# Altium integrated library Cap-Cer-SMD_V2.IntLib: 957 symbols (part 3 of 7)
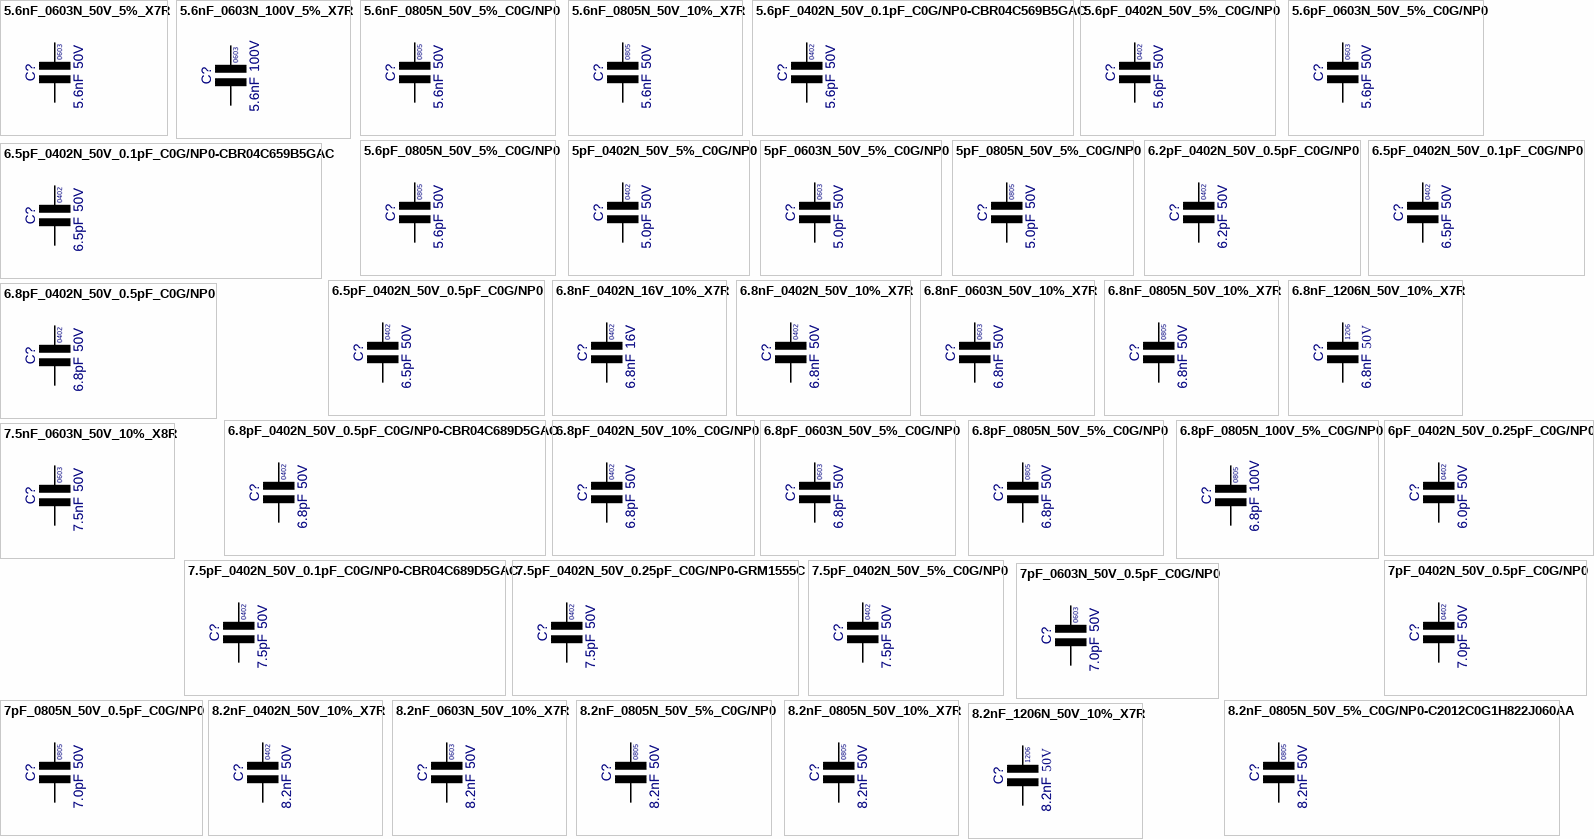
[diagram p25: symbols 5.6nF_0603N_50V_5%_X7R to 8.2nF_1206N_50V_10%_X7R]

## 6.8nF_0402N_16V_10%_X7R
designator C?, comment value 6.8nF  Voltage: 16V  Text1: 0402  (hidden comment: 6.8nF_C0402_16V_10%_X7R)
Cap Ceramic X7R; Manufacturer: Various; Part Number: 6.8nF 0402 16V 10% X7R; Tol: 10%; Package: CAPC0402X60N; EDM-PN: *; Text2: *; SAAB PN: *; DCE Part No: *
footprint CAPC0402X60N (Chip Capacitor, 0402, 2-Leads, Body 1.0x0.5mm, IPC Medium Density)
pins: 1, 2

## 6.8nF_0402N_50V_10%_X7R
designator C?, comment value 6.8nF  Voltage: 50V  Text1: 0402  (hidden comment: 6.8nF_C0402_50V_10%_X7R)
Cap Ceramic X7R; Manufacturer: Various; Part Number: 6.8nF 0402 50V 10% X7R; Tol: 10%; Package: CAPC0402X60N; EDM-PN: *; Text2: *; SAAB PN: *; DCE Part No: *
footprint CAPC0402X60N (Chip Capacitor, 0402, 2-Leads, Body 1.0x0.5mm, IPC Medium Density)
pins: 1, 2

## 6.8nF_0603N_50V_10%_X7R
designator C?, comment value 6.8nF  Voltage: 50V  Text1: 0603  (hidden comment: 6.8nF_C0603_50V_10%_X7R)
Cap Ceramic X7R; Manufacturer: Various; Part Number: 6.8nF 0603 50V 10% X7R; EDM-PN: CAP725; Tol: 10%; Reutech PN: 5910-CA-0568; Package: CAPC0603X85N; Text2: *; SAAB PN: *; DCE Part No: *
footprint CAPC0603X85N (Chip Capacitor, 0603, 2-Leads, Body 1.6x0.8mm, IPC Medium Density)
pins: 1, 2

## 6.8nF_0805N_50V_10%_X7R
designator C?, comment value 6.8nF  Voltage: 50V  Text1: 0805  (hidden comment: 6.8nF_C0805_50V_10%_X7R)
Cap Ceramic X7R; Manufacturer: Various; Part Number: 6.8nF 0805 50V 10% X7R; Tol: 10%; Package: CAPC0805X110N; EDM-PN: *; Text2: *; SAAB PN: *; DCE Part No: *
footprint CAPC0805X110N (Chip Capacitor, 0805, 2-Leads, Body 2.0x1.3mm, IPC Medium Density)
pins: 1, 2

## 6.8nF_1206N_50V_10%_X7R
designator C?, comment value 6.8nF  Voltage: 50V  Text1: 1206  (hidden comment: 6.8nF_C1206_50V_10%_X7R)
Cap Ceramic X7R; Manufacturer: Various; Part Number: 6.8nF 1206 50V 10% X7R; Tol: 10%; Package: CAPC1206X135N; EDM-PN: *; Text2: *; SAAB PN: *; DCE Part No: *
footprint CAPC1206X135N (Chip Capacitor, 1206, 2-Leads, Body 3.2x1.6mm, IPC Medium Density)
pins: 1, 2

## 6.8pF_0402N_50V_0.5pF_C0G/NP0
designator C?, comment value 6.8pF  Voltage: 50V  Text1: 0402  (hidden comment: 6.8pF_C0402_50V_0.5pF_C0G/NP0)
Cap Ceramic C0G/NP0; Manufacturer: Various; Part Number: 6.8pF 0402 50V 0.5pF C0G/NP0; Tol: 0.5pF; Package: CAPC0402X60N; EDM-PN: *; Text2: *; SAAB PN: *; DCE Part No: *
footprint CAPC0402X60N (Chip Capacitor, 0402, 2-Leads, Body 1.0x0.5mm, IPC Medium Density)
pins: 1, 2

## 6.8pF_0402N_50V_0.5pF_C0G/NP0-CBR04C689D5GAC
designator C?, comment value 6.8pF  Voltage: 50V  Text1: 0402  (hidden comment: CBR04C689D5GAC)
Cap Ceramic C0G/NP0 HiQ-CBR Series for RF; Manufacturer: Kemet; EDM-PN: CAP1398; Tol: 0.5pF; Part Number: CBR04C689D5GAC; Package: CAPC0402X60N; Text2: *; SAAB PN: *; DCE Part No: *
footprint CAPC0402X60N (Chip Capacitor, 0402, 2-Leads, Body 1.0x0.5mm, IPC Medium Density)
pins: 1, 2

## 6.8pF_0402N_50V_10%_C0G/NP0
designator C?, comment value 6.8pF  Voltage: 50V  Text1: 0402  (hidden comment: 6.8pF_C0402_50V_10%_C0G/NP0)
Cap Ceramic C0G/NP0; Manufacturer: Various; Part Number: 6.8pF 0402 50V 10% C0G/NP0; Tol: 10%; Package: CAPC0402X60N; EDM-PN: *; Text2: *; SAAB PN: *; DCE Part No: *
footprint CAPC0402X60N (Chip Capacitor, 0402, 2-Leads, Body 1.0x0.5mm, IPC Medium Density)
pins: 1, 2

## 6.8pF_0603N_50V_5%_C0G/NP0
designator C?, comment value 6.8pF  Voltage: 50V  Text1: 0603  (hidden comment: 6.8pF_C0603_50V_5%_C0G/NP0)
Cap Ceramic C0G/NP0; Manufacturer: Various; Part Number: 6.8pF 0603 50V 5% C0G/NP0; EDM-PN: CAP648; Tol: 5%; Package: CAPC0603X85N; Text2: *; SAAB PN: *; DCE Part No: *
footprint CAPC0603X85N (Chip Capacitor, 0603, 2-Leads, Body 1.6x0.8mm, IPC Medium Density)
pins: 1, 2

## 6.8pF_0805N_50V_5%_C0G/NP0
designator C?, comment value 6.8pF  Voltage: 50V  Text1: 0805  (hidden comment: 6.8pF_C0805_50V_5%_C0G/NP0)
Cap Ceramic C0G/NP0; Manufacturer: Various; Part Number: 6.8pF 0805 50V 5% C0G/NP0; EDM-PN: CAP16; Tol: 5%; Package: CAPC0805X110N; Text2: *; SAAB PN: *; DCE Part No: *
footprint CAPC0805X110N (Chip Capacitor, 0805, 2-Leads, Body 2.0x1.3mm, IPC Medium Density)
pins: 1, 2

## 6.8pF_0805N_100V_5%_C0G/NP0
designator C?, comment value 6.8pF  Voltage: 100V  Text1: 0805  (hidden comment: 6.8pF_C0805_100V_5%_C0G/NP0)
Cap Ceramic C0G/NP0; Manufacturer: Various; Part Number: 6.8pF 0805 100V 5% C0G/NP0; Tol: 5%; Package: CAPC0805X110N; Text2: *; SAAB PN: *; DCE Part No: *
footprint CAPC0805X110N (Chip Capacitor, 0805, 2-Leads, Body 2.0x1.3mm, IPC Medium Density)
pins: 1, 2

## 6pF_0402N_50V_0.25pF_C0G/NP0
designator C?, comment value 6.0pF  Voltage: 50V  Text1: 0402  (hidden comment: 6pF_C0402_50V_0.25pF_C0G/NP0)
Cap Ceramic NP0; Manufacturer: Various; Part Number: 6.0pF 0402 50V 0.25pF C0G/NP0; Tol: 0.25pF; Package: CAPC0402X60N; EDM-PN: *; Text2: *; SAAB PN: *; DCE Part No: *
footprint CAPC0402X60N (Chip Capacitor, 0402, 2-Leads, Body 1.0x0.5mm, IPC Medium Density)
pins: 1, 2

## 7.5nF_0603N_50V_10%_X8R
designator C?, comment value 7.5nF  Voltage: 50V  Text1: 0603  (hidden comment: 7.5nF_C0603_50V_10%_X8R)
Cap Ceramic X8R; Manufacturer: Various; Part Number: 7.5nF 0603 50V 10% X8R; Tol: 10%; Package: CAPC0603X85N; EDM-PN: *; Text2: *; SAAB PN: *; DCE Part No: *
footprint CAPC0603X85N (Chip Capacitor, 0603, 2-Leads, Body 1.6x0.8mm, IPC Medium Density)
pins: 1, 2

## 7.5pF_0402N_50V_0.1pF_C0G/NP0-CBR04C689D5GAC
designator C?, comment value 7.5pF  Voltage: 50V  Text1: 0402  (hidden comment: CBR04C689D5GAC)
Cap Ceramic C0G/NP0 HiQ-CBR Series for RF; Manufacturer: Kemet; EDM-PN: CAP1399; Tol: 0.1pF; Part Number: CBR04C689D5GAC; Package: CAPC0402X60N; Text2: *; SAAB PN: *; DCE Part No: *
footprint CAPC0402X60N (Chip Capacitor, 0402, 2-Leads, Body 1.0x0.5mm, IPC Medium Density)
pins: 1, 2

## 7.5pF_0402N_50V_0.25pF_C0G/NP0-GRM1555C
designator C?, comment value 7.5pF  Voltage: 50V  Text1: 0402  (hidden comment: GRM1555C1H7R5CA01D)
Cap Ceramic C0G/NP0; Manufacturer: Murata; EDM-PN: CAP786; Tol: 0.25pF; Part Number: GRM1555C1H7R5CA01D; Package: GRM155-0.20; Text2: *; SAAB PN: *; DCE Part No: *
footprint GRM155-0.20 (GRM155 0402 1.0x0.5mm)
pins: 1, 2

## 7.5pF_0402N_50V_5%_C0G/NP0
designator C?, comment value 7.5pF  Voltage: 50V  Text1: 0402  (hidden comment: 7.5pF_C0402_50V_5%_C0G/NP0)
Cap Ceramic C0G/NP0; Manufacturer: Various; Part Number: 7.5pF 0402 50V 5% C0G/NP0; Tol: 5%; Package: CAPC0402X60N; EDM-PN: *; Text2: *; SAAB PN: *; DCE Part No: *
footprint CAPC0402X60N (Chip Capacitor, 0402, 2-Leads, Body 1.0x0.5mm, IPC Medium Density)
pins: 1, 2

## 7pF_0402N_50V_0.5pF_C0G/NP0
designator C?, comment value 7.0pF  Voltage: 50V  Text1: 0402  (hidden comment: 7pF_C0402_50V_0.5pF_C0G/NP0)
Cap Ceramic C0G/NP0; Manufacturer: Various; Part Number: 7.0pF 0402 50V 0.5pF C0G/NP0; Tol: 0.5pF; Package: CAPC0402X60N; EDM-PN: *; Text2: *; SAAB PN: *; DCE Part No: *
footprint CAPC0402X60N (Chip Capacitor, 0402, 2-Leads, Body 1.0x0.5mm, IPC Medium Density)
pins: 1, 2

## 7pF_0603N_50V_0.5pF_C0G/NP0
designator C?, comment value 7.0pF  Voltage: 50V  Text1: 0603  (hidden comment: 7pF_C0603_50V_0.5pF_C0G/NP0)
Cap Ceramic C0G/NP0; Manufacturer: Various; Part Number: 7.0pF 0603 50V 0.5pF C0G/NP0; Tol: 0.5pF; Package: CAPC0603X85N; EDM-PN: *; Text2: *; SAAB PN: *; DCE Part No: *
footprint CAPC0603X85N (Chip Capacitor, 0603, 2-Leads, Body 1.6x0.8mm, IPC Medium Density)
pins: 1, 2

## 7pF_0805N_50V_0.5pF_C0G/NP0
designator C?, comment value 7.0pF  Voltage: 50V  Text1: 0805  (hidden comment: 7pF_C0805_50V_0.5pF_C0G/NP0)
Cap Ceramic C0G/NP0; Manufacturer: Various; Part Number: 7.0pF 0805 50V 0.5pF C0G/NP0; Tol: 0.5pF; Package: CAPC0805X110N; EDM-PN: *; Text2: *; SAAB PN: *; DCE Part No: *
footprint CAPC0805X110N (Chip Capacitor, 0805, 2-Leads, Body 2.0x1.3mm, IPC Medium Density)
pins: 1, 2

## 8.2nF_0402N_50V_10%_X7R
designator C?, comment value 8.2nF  Voltage: 50V  Text1: 0402  (hidden comment: 8.3nF_C0402_50V_10%_X7R)
Cap Ceramic X7R; Manufacturer: Various; Part Number: 8.2nF 0402 50V 10% X7R; Tol: 10%; Package: CAPC0402X60N; EDM-PN: *; Text2: *; SAAB PN: *; DCE Part No: *
footprint CAPC0402X60N (Chip Capacitor, 0402, 2-Leads, Body 1.0x0.5mm, IPC Medium Density)
pins: 1, 2

## 8.2nF_0603N_50V_10%_X7R
designator C?, comment value 8.2nF  Voltage: 50V  Text1: 0603  (hidden comment: 8.2nF_C0603_50V_10%_X7R)
Cap Ceramic X7R; Manufacturer: Various; Part Number: 8.2nF 0603 50V 10% X7R; Tol: 10%; Package: CAPC0603X85N; EDM-PN: *; Text2: *; SAAB PN: *; DCE Part No: *
footprint CAPC0603X85N (Chip Capacitor, 0603, 2-Leads, Body 1.6x0.8mm, IPC Medium Density)
pins: 1, 2

## 8.2nF_0805N_50V_5%_C0G/NP0
designator C?, comment value 8.2nF  Voltage: 50V  Text1: 0805  (hidden comment: 8.2nF_C0805_50V_5%_C0G/NP0)
Cap Ceramic C0G/NP0; Manufacturer: Various; Part Number: 8.2nF 0805 50V 5% C0G/NP0; Tol: 5%; Package: CAPC0805X110N; EDM-PN: *; Text2: *; SAAB PN: *; DCE Part No: *
footprint CAPC0805X110N (Chip Capacitor, 0805, 2-Leads, Body 2.0x1.3mm, IPC Medium Density)
pins: 1, 2

## 8.2nF_0805N_50V_5%_C0G/NP0-C2012C0G1H822J060AA
designator C?, comment value 8.2nF  Voltage: 50V  Text1: 0805  (hidden comment: C2012C0G1H822J060AA)
Cap Ceramic C0G/NP0 Low ESL; Manufacturer: TDK; Tol: 5%; Part Number: C2012C0G1H822J060AA; Package: CAPC0805X110N; EDM-PN: *; Text2: *; Reutech PN: *; SAAB PN: *; DCE Part No: *
footprint CAPC0805X110N (Chip Capacitor, 0805, 2-Leads, Body 2.0x1.3mm, IPC Medium Density)
pins: 1, 2

## 8.2nF_0805N_50V_10%_X7R
designator C?, comment value 8.2nF  Voltage: 50V  Text1: 0805  (hidden comment: 8.2nF_C0805_50V_10%_X7R)
Cap Ceramic X7R; Manufacturer: Various; Part Number: 8.2nF 0805 50V 10% X7R; Tol: 10%; Package: CAPC0805X110N; EDM-PN: *; Text2: *; SAAB PN: *; DCE Part No: *
footprint CAPC0805X110N (Chip Capacitor, 0805, 2-Leads, Body 2.0x1.3mm, IPC Medium Density)
pins: 1, 2

## 8.2nF_1206N_50V_10%_X7R
designator C?, comment value 8.2nF  Voltage: 50V  Text1: 1206  (hidden comment: 8.2nF_C1206_50V_10%_X7R)
Cap Ceramic X7R; Manufacturer: Various; Part Number: 8.2nF 1206 50V 10% X7R; Tol: 10%; Package: CAPC1206X135N; EDM-PN: *; Text2: *; SAAB PN: *; DCE Part No: *
footprint CAPC1206X135N (Chip Capacitor, 1206, 2-Leads, Body 3.2x1.6mm, IPC Medium Density)
pins: 1, 2

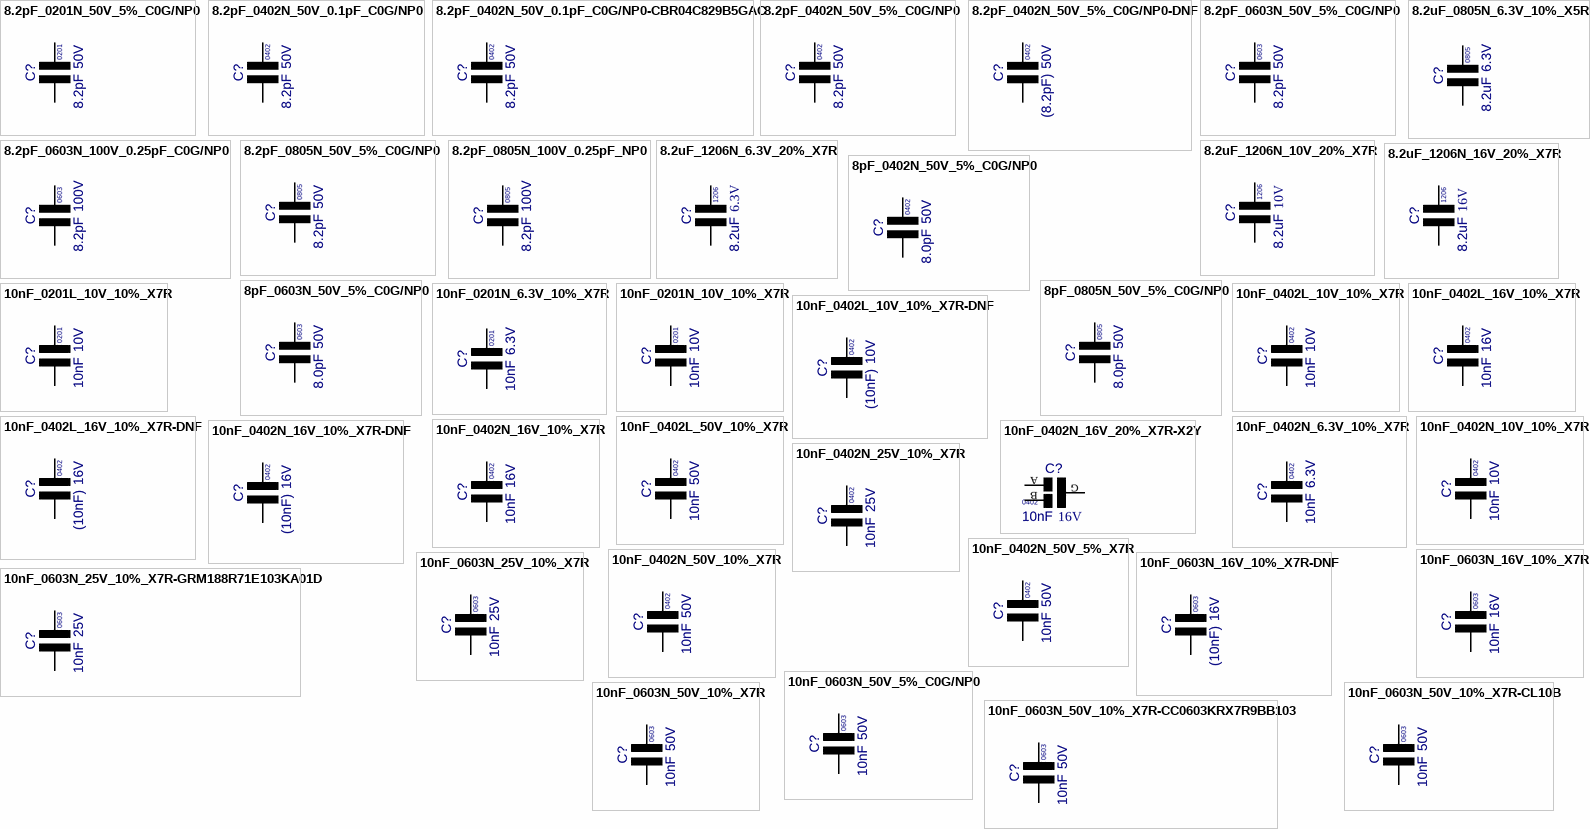
[diagram p8: symbols 8.2pF_0201N_50V_5%_C0G/NP0 to 10nF_0603N_50V_10%_X7R-CL10B]

## 8.2pF_0201N_50V_5%_C0G/NP0
designator C?, comment value 8.2pF  Voltage: 50V  Text1: 0201  (hidden comment: 8.2pF_C0201_50V_5%_C0G/NP0)
Cap Ceramic C0G; Manufacturer: Various; Part Number: 8.2pF 0201 50V 5%_C0G/NP0; Tol: 5%; Package: CAPC0201X33N; EDM-PN: *; Text2: *; SAAB PN: *; DCE Part No: *
footprint CAPC0201X33N (Chip Capacitor, 0201, 2-Leads, Body 0.6x0.3mm, IPC Medium Density)
pins: 1, 2

## 8.2pF_0402N_50V_0.1pF_C0G/NP0
designator C?, comment value 8.2pF  Voltage: 50V  Text1: 0402  (hidden comment: 8.2pF_C0402_50V_0.1pF_C0G/NP0)
Cap Ceramic C0G/NP0; Manufacturer: Various; Part Number: 8.2pF 0402 50V 0.1pF C0G/NP0; Tol: 0.1pF; Package: CAPC0402X60N; EDM-PN: *; Text2: *; SAAB PN: *; DCE Part No: *
footprint CAPC0402X60N (Chip Capacitor, 0402, 2-Leads, Body 1.0x0.5mm, IPC Medium Density)
pins: 1, 2

## 8.2pF_0402N_50V_0.1pF_C0G/NP0-CBR04C829B5GAC
designator C?, comment value 8.2pF  Voltage: 50V  Text1: 0402  (hidden comment: CBR04C829B5GAC)
Cap Ceramic C0G/NP0 HiQ-CBR Series for RF; Manufacturer: Kemet; EDM-PN: CAP1429; Tol: 0.1pF; Part Number: CBR04C829B5GAC; Package: CAPC0402X60N; Text2: *; SAAB PN: *; DCE Part No: *
footprint CAPC0402X60N (Chip Capacitor, 0402, 2-Leads, Body 1.0x0.5mm, IPC Medium Density)
pins: 1, 2

## 8.2pF_0402N_50V_5%_C0G/NP0
designator C?, comment value 8.2pF  Voltage: 50V  Text1: 0402  (hidden comment: 8.2pF_C0402_50V_5%_C0G/NP0)
Cap Ceramic C0G/NP0; Manufacturer: Various; Part Number: 8.2pF 0402 50V 5% C0G/NP0; Tol: 5%; Package: CAPC0402X60N; EDM-PN: *; Text2: *; SAAB PN: *; DCE Part No: *
footprint CAPC0402X60N (Chip Capacitor, 0402, 2-Leads, Body 1.0x0.5mm, IPC Medium Density)
pins: 1, 2

## 8.2pF_0402N_50V_5%_C0G/NP0-DNF
designator C?, comment value (8.2pF)  Voltage: 50V  Text1: 0402  (hidden comment: 8.2pF_C0402_50V_5%_C0G/NP0)
Cap Ceramic C0G/NP0 - Do not Fit; Manufacturer: Various; Part Number: DNF - 8.2pF 0402 50V 5% C0G/NP0; Tol: 5%; Package: CAPC0402X60N; EDM-PN: *; Text2: *; SAAB PN: *; DCE Part No: *
footprint CAPC0402X60N (Chip Capacitor, 0402, 2-Leads, Body 1.0x0.5mm, IPC Medium Density)
pins: 1, 2

## 8.2pF_0603N_50V_5%_C0G/NP0
designator C?, comment value 8.2pF  Voltage: 50V  Text1: 0603  (hidden comment: 8.2pF_C0603_50V_5%_C0G/NP0)
Cap Ceramic C0G/NP0; Manufacturer: Various; Part Number: 8.2pF 0603 50V 5% C0G/NP0; Tol: 5%; Package: CAPC0603X85N; EDM-PN: *; Text2: *; SAAB PN: *; DCE Part No: *
footprint CAPC0603X85N (Chip Capacitor, 0603, 2-Leads, Body 1.6x0.8mm, IPC Medium Density)
pins: 1, 2

## 8.2pF_0603N_100V_0.25pF_C0G/NP0
designator C?, comment value 8.2pF  Voltage: 100V  Text1: 0603  (hidden comment: 8.2pF_C0603_100V_0.25pF_C0G/NP0)
Cap Ceramic C0G/NP0; Manufacturer: Various; Part Number: 8.2pF 0603 100V 0.25pF C0G/NP0; Tol: 0.25pF; Package: CAPC0603X85N; EDM-PN: *; Text2: *; SAAB PN: *; DCE Part No: *
footprint CAPC0603X85N (Chip Capacitor, 0603, 2-Leads, Body 1.6x0.8mm, IPC Medium Density)
pins: 1, 2

## 8.2pF_0805N_50V_5%_C0G/NP0
designator C?, comment value 8.2pF  Voltage: 50V  Text1: 0805  (hidden comment: 8.2pF_C0805_50V_5%_C0G/NP0)
Cap Ceramic C0G/NP0; Manufacturer: Various; Part Number: 8.2pF 0805 50V 5% C0G/NP0; Tol: 5%; Package: CAPC0805X110N; EDM-PN: *; Text2: *; SAAB PN: *; DCE Part No: *
footprint CAPC0805X110N (Chip Capacitor, 0805, 2-Leads, Body 2.0x1.3mm, IPC Medium Density)
pins: 1, 2

## 8.2pF_0805N_100V_0.25pF_NP0
designator C?, comment value 8.2pF  Voltage: 100V  Text1: 0805  (hidden comment: 8.2pF_C0805_100V_0.25pF_NP0)
Cap Ceramic NP0; Manufacturer: Various; Part Number: 8.2pF 0805 100V 0.25pF C0G/NP0; Tol: 0.25pF; Package: CAPC0805X110N; EDM-PN: *; Text2: *; SAAB PN: *; DCE Part No: *
footprint CAPC0805X110N (Chip Capacitor, 0805, 2-Leads, Body 2.0x1.3mm, IPC Medium Density)
pins: 1, 2

## 8.2uF_0805N_6.3V_10%_X5R
designator C?, comment value 8.2uF  Voltage: 6.3V  Text1: 0805  (hidden comment: 8.2uF_C0805_6.3V_10%_X5R)
Cap Ceramic X5R; Manufacturer: Various; Part Number: 8.2uF 0805 6.3V 10% X5R; Tol: 10%; Package: CAPC0805X110N; EDM-PN: *; Text2: *; SAAB PN: *; DCE Part No: *
footprint CAPC0805X110N (Chip Capacitor, 0805, 2-Leads, Body 2.0x1.3mm, IPC Medium Density)
pins: 1, 2

## 8.2uF_1206N_6.3V_20%_X7R
designator C?, comment value 8.2uF  Voltage: 6.3V  Text1: 1206  (hidden comment: 8.2uF_C1206_6.3V_20%_X7R)
Cap Ceramic X7R; Manufacturer: Various; Part Number: 8.2uF 1206 6.3V 20% X7R; Tol: 20%; Package: CAPC1206X135N; EDM-PN: *; Text2: *; SAAB PN: *; DCE Part No: *
footprint CAPC1206X135N (Chip Capacitor, 1206, 2-Leads, Body 3.2x1.6mm, IPC Medium Density)
pins: 1, 2

## 8.2uF_1206N_10V_20%_X7R
designator C?, comment value 8.2uF  Voltage: 10V  Text1: 1206  (hidden comment: 8.2uF_C1206_10V_20%_X7R)
Cap Ceramic X7R; Manufacturer: Various; Part Number: 8.2uF 1206 10V 20% X7R; Tol: 20%; Package: CAPC1206X135N; EDM-PN: *; Text2: *; SAAB PN: *; DCE Part No: *
footprint CAPC1206X135N (Chip Capacitor, 1206, 2-Leads, Body 3.2x1.6mm, IPC Medium Density)
pins: 1, 2

## 8.2uF_1206N_16V_20%_X7R
designator C?, comment value 8.2uF  Voltage: 16V  Text1: 1206  (hidden comment: 8.2uF_C1206_16V_20%_X7R)
Cap Ceramic X7R; Manufacturer: Various; Part Number: 8.2uF 1206 16V 20% X7R; Tol: 20%; Package: CAPC1206X135N; EDM-PN: *; Text2: *; SAAB PN: *; DCE Part No: *
footprint CAPC1206X135N (Chip Capacitor, 1206, 2-Leads, Body 3.2x1.6mm, IPC Medium Density)
pins: 1, 2

## 8pF_0402N_50V_5%_C0G/NP0
designator C?, comment value 8.0pF  Voltage: 50V  Text1: 0402  (hidden comment: 8.0pF_C0402_50V_5%_C0G/NP0)
Cap Ceramic C0G/NP0; Manufacturer: Various; Part Number: 8.0pF 0402 50V 5% C0G/NP0; Tol: 5%; Package: CAPC0402X60N; EDM-PN: *; Text2: *; SAAB PN: *; DCE Part No: *
footprint CAPC0402X60N (Chip Capacitor, 0402, 2-Leads, Body 1.0x0.5mm, IPC Medium Density)
pins: 1, 2

## 8pF_0603N_50V_5%_C0G/NP0
designator C?, comment value 8.0pF  Voltage: 50V  Text1: 0603  (hidden comment: 8.0pF_C0603_50V_5%_C0G/NP0)
Cap Ceramic C0G/NP0; Manufacturer: Various; Part Number: 8.0pF 0603 50V 5% C0G/NP0; Tol: 5%; Package: CAPC0603X85N; EDM-PN: *; Text2: *; SAAB PN: *; DCE Part No: *
footprint CAPC0603X85N (Chip Capacitor, 0603, 2-Leads, Body 1.6x0.8mm, IPC Medium Density)
pins: 1, 2

## 8pF_0805N_50V_5%_C0G/NP0
designator C?, comment value 8.0pF  Voltage: 50V  Text1: 0805  (hidden comment: 8.0pF_C0805_50V_5%_C0G/NP0)
Cap Ceramic C0G/NP0; Manufacturer: Various; Part Number: 8.0pF 0805 50V 5% C0G/NP0; Tol: 5%; Package: CAPC0805X110N; EDM-PN: *; Text2: *; SAAB PN: *; DCE Part No: *
footprint CAPC0805X110N (Chip Capacitor, 0805, 2-Leads, Body 2.0x1.3mm, IPC Medium Density)
pins: 1, 2

## 10nF_0201L_10V_10%_X7R
designator C?, comment value 10nF  Voltage: 10V  Text1: 0201  (hidden comment: 10nF_C0201L_10V_10%_X7R)
Cap Ceramic X7R; Manufacturer: Various; Part Number: 10nF 0201 10V 10% X7R; Tol: 10%; Package: CAPC0201X33L; EDM-PN: *; Text2: *; SAAB PN: *; DCE Part No: *
footprint CAPC0201X33L (Chip Capacitor, 0201, 2-Leads, Body 0.6x0.3mm, IPC Low Density)
pins: 1, 2

## 10nF_0201N_6.3V_10%_X7R
designator C?, comment value 10nF  Voltage: 6.3V  Text1: 0201  (hidden comment: 10nF_C0201_6.3V_10%_X7R)
Cap Ceramic X7R; Manufacturer: Various; Part Number: 10nF 0201 6.3V 10% X7R; Tol: 10%; Package: CAPC0201X33N; EDM-PN: *; Text2: *; SAAB PN: *; DCE Part No: *
footprint CAPC0201X33N (Chip Capacitor, 0201, 2-Leads, Body 0.6x0.3mm, IPC Medium Density)
pins: 1, 2

## 10nF_0201N_10V_10%_X7R
designator C?, comment value 10nF  Voltage: 10V  Text1: 0201  (hidden comment: 10nF_C0201_10V_10%_X7R)
Cap Ceramic X7R; Manufacturer: Various; Part Number: 10nF 0201 10V 10% X7R; EDM-PN: CAP606; Tol: 10%; Package: CAPC0201X33N; Text2: *; SAAB PN: *; DCE Part No: *
footprint CAPC0201X33N (Chip Capacitor, 0201, 2-Leads, Body 0.6x0.3mm, IPC Medium Density)
pins: 1, 2

## 10nF_0402L_10V_10%_X7R
designator C?, comment value 10nF  Voltage: 10V  Text1: 0402  (hidden comment: 10nF_C0402_10V_10%_X7R)
Cap Ceramic X7R; Manufacturer: Various; Part Number: 10nF 0402 10V 10% X7R; Tol: 10%; Package: CAPC0402X60L; EDM-PN: *; Text2: *; SAAB PN: *; DCE Part No: *
footprint CAPC0402X60L (Chip Capacitor, 0402, 2-Leads, Body 1.0x0.5mm, IPC High Density)
pins: 1, 2

## 10nF_0402L_10V_10%_X7R-DNF
designator C?, comment value (10nF)  Voltage: 10V  Text1: 0402  (hidden comment: 10nF_C0402_10V_10%_X7R)
Cap Ceramic X7R - Do not Fit; Manufacturer: Various; Part Number: DNF - 10nF 0402 10V 10% X7R; Tol: 10%; Package: CAPC0402X60L; EDM-PN: *; Text2: *; SAAB PN: *; DCE Part No: *
footprint CAPC0402X60L (Chip Capacitor, 0402, 2-Leads, Body 1.0x0.5mm, IPC High Density)
pins: 1, 2

## 10nF_0402L_16V_10%_X7R
designator C?, comment value 10nF  Voltage: 16V  Text1: 0402  (hidden comment: 10nF_C0402_16V_10%_X7R)
Cap Ceramic X7R; Manufacturer: Various; Part Number: 10nF 0402 16V 10% X7R; Tol: 10%; Package: CAPC0402X60L; EDM-PN: *; Text2: *; SAAB PN: *; DCE Part No: *
footprint CAPC0402X60L (Chip Capacitor, 0402, 2-Leads, Body 1.0x0.5mm, IPC High Density)
pins: 1, 2

## 10nF_0402L_16V_10%_X7R-DNF
designator C?, comment value (10nF)  Voltage: 16V  Text1: 0402  (hidden comment: 10nF_C0402_16V_10%_X7R)
Cap Ceramic X7R - Do not Fit; Manufacturer: Various; Part Number: DNF - 10nF 0402 16V 10% X7R; Tol: 10%; Package: CAPC0402X60L; EDM-PN: *; Text2: *; SAAB PN: *; DCE Part No: *
footprint CAPC0402X60L (Chip Capacitor, 0402, 2-Leads, Body 1.0x0.5mm, IPC High Density)
pins: 1, 2

## 10nF_0402L_50V_10%_X7R
designator C?, comment value 10nF  Voltage: 50V  Text1: 0402  (hidden comment: 10nF_C0402_50V_10%_X7R)
Cap Ceramic X7R; Manufacturer: Various; Part Number: 10nF 0402 50V 10% X7R; DCE Part No: 9022; EDM-PN: CAP795; Tol: 10%; SAAB PN: 1AAB00468AEA; Package: CAPC0402X60L; Text2: *
footprint CAPC0402X60L (Chip Capacitor, 0402, 2-Leads, Body 1.0x0.5mm, IPC High Density)
pins: 1, 2

## 10nF_0402N_6.3V_10%_X7R
designator C?, comment value 10nF  Voltage: 6.3V  Text1: 0402  (hidden comment: 10nF_C0402_6.3V_10%_X7R)
Cap Ceramic X7R; Manufacturer: Various; Part Number: 10nF 0402 6.3V 10% X7R; Tol: 10%; Package: CAPC0402X60N; EDM-PN: *; Text2: *; SAAB PN: *; DCE Part No: *
footprint CAPC0402X60N (Chip Capacitor, 0402, 2-Leads, Body 1.0x0.5mm, IPC Medium Density)
pins: 1, 2

## 10nF_0402N_10V_10%_X7R
designator C?, comment value 10nF  Voltage: 10V  Text1: 0402  (hidden comment: 10nF_C0402_10V_10%_X7R)
Cap Ceramic X7R; Manufacturer: Various; Part Number: 10nF 0402 10V 10% X7R; EDM-PN: CAP1032; Tol: 10%; Package: CAPC0402X60N; Text2: *; SAAB PN: *; DCE Part No: *
footprint CAPC0402X60N (Chip Capacitor, 0402, 2-Leads, Body 1.0x0.5mm, IPC Medium Density)
pins: 1, 2

## 10nF_0402N_16V_10%_X7R
designator C?, comment value 10nF  Voltage: 16V  Text1: 0402  (hidden comment: 10nF_C0402_16V_10%_X7R)
Cap Ceramic X7R; Manufacturer: Various; Part Number: 10nF 0402 16V 10% X7R; Tol: 10%; Package: CAPC0402X60N; EDM-PN: *; Text2: *; SAAB PN: *; DCE Part No: *
footprint CAPC0402X60N (Chip Capacitor, 0402, 2-Leads, Body 1.0x0.5mm, IPC Medium Density)
pins: 1, 2

## 10nF_0402N_16V_10%_X7R-DNF
designator C?, comment value (10nF)  Voltage: 16V  Text1: 0402  (hidden comment: 10nF_C0402_16V_10%_X7R)
Cap Ceramic X7R - Do not Fit; Manufacturer: Various; Part Number: DNF - 10nF 0402 16V 10% X7R; Tol: 10%; Package: CAPC0402X60N; EDM-PN: *; Text2: *; SAAB PN: *; DCE Part No: *
footprint CAPC0402X60N (Chip Capacitor, 0402, 2-Leads, Body 1.0x0.5mm, IPC Medium Density)
pins: 1, 2

## 10nF_0402N_16V_20%_X7R-X2Y
designator C?, comment value 10nF  Voltage: 16V  Text1: 0402  (hidden comment: X2Y-10nF_C0402_16V_20%_X7R)
Cap Ceramic X2Y; Manufacturer: Johanson; Part Number: 160X07W103MV4T; Tol: 20%; Package: CAPC0402-X2Y; EDM-PN: *; Text2: *; SAAB PN: *; DCE Part No: *
footprint CAPC0402-X2Y (Cap 0402 X2Y 1.1x0.6mm)
pins: A, B, G

## 10nF_0402N_25V_10%_X7R
designator C?, comment value 10nF  Voltage: 25V  Text1: 0402  (hidden comment: 10nF_C0402_25V_10%_X7R)
Cap Ceramic X7R; Manufacturer: Various; Part Number: 10nF 0402 25V 10% X7R; EDM-PN: CAP327; Tol: 10%; Package: CAPC0402X60N; Text2: *; SAAB PN: *; DCE Part No: *
footprint CAPC0402X60N (Chip Capacitor, 0402, 2-Leads, Body 1.0x0.5mm, IPC Medium Density)
pins: 1, 2

## 10nF_0402N_50V_5%_X7R
designator C?, comment value 10nF  Voltage: 50V  Text1: 0402  (hidden comment: 10nF_C0402_50V_5%_X7R)
Cap Ceramic X7R; Manufacturer: Various; Part Number: 10nF 0402 50V 5% X7R; EDM-PN: CAP1266; Tol: 5%; Package: CAPC0402X60N; Text2: *; SAAB PN: *; DCE Part No: *
footprint CAPC0402X60N (Chip Capacitor, 0402, 2-Leads, Body 1.0x0.5mm, IPC Medium Density)
pins: 1, 2

## 10nF_0402N_50V_10%_X7R
designator C?, comment value 10nF  Voltage: 50V  Text1: 0402  (hidden comment: 10nF_C0402_50V_10%_X7R)
Cap Ceramic X7R; Manufacturer: Various; Part Number: 10nF 0402 50V 10% X7R; DCE Part No: 9022; EDM-PN: CAP795; Tol: 10%; SAAB PN: 1AAB00468AEA; Package: CAPC0402X60N; Text2: *
footprint CAPC0402X60N (Chip Capacitor, 0402, 2-Leads, Body 1.0x0.5mm, IPC Medium Density)
pins: 1, 2

## 10nF_0603N_16V_10%_X7R
designator C?, comment value 10nF  Voltage: 16V  Text1: 0603  (hidden comment: 10nF_C0603_16V_10%_X7R)
Cap Ceramic X7R; Manufacturer: Various; Part Number: 10nF 0603 16V 10% X7R; EDM-PN: CAP921; Tol: 10%; Package: CAPC0603X85N; Text2: *; SAAB PN: *; DCE Part No: *
footprint CAPC0603X85N (Chip Capacitor, 0603, 2-Leads, Body 1.6x0.8mm, IPC Medium Density)
pins: 1, 2

## 10nF_0603N_16V_10%_X7R-DNF
designator C?, comment value (10nF)  Voltage: 16V  Text1: 0603  (hidden comment: 10nF_C0603_16V_10%_X7R-DNF)
Cap Ceramic X7R - Do Not Fit; Manufacturer: Various; Part Number: DNF - 10nF 0603 16V 10% X7R; EDM-PN: CAP921; Tol: 10%; Reutech PN: (5910-CA-0402); Package: CAPC0603X85N; Text2: *; SAAB PN: *; DCE Part No: *
footprint CAPC0603X85N (Chip Capacitor, 0603, 2-Leads, Body 1.6x0.8mm, IPC Medium Density)
pins: 1, 2

## 10nF_0603N_25V_10%_X7R
designator C?, comment value 10nF  Voltage: 25V  Text1: 0603  (hidden comment: 10nF_C0603_25V_10%_X7R)
Cap Ceramic X7R; Manufacturer: Various; Part Number: 10nF 0603 25V 10% X7R; Tol: 10%; Reutech PN: 5910-CA-0402; Package: CAPC0603X85N; EDM-PN: *; Text2: *; SAAB PN: *; DCE Part No: *
footprint CAPC0603X85N (Chip Capacitor, 0603, 2-Leads, Body 1.6x0.8mm, IPC Medium Density)
pins: 1, 2

## 10nF_0603N_25V_10%_X7R-GRM188R71E103KA01D
designator C?, comment value 10nF  Voltage: 25V  Text1: 0603  (hidden comment: GRM188R71E103KA01D)
Cap Ceramic X7R; Manufacturer: Murata; Tol: 10%; Reutech PN: 5910-CA-0402; Part Number: GRM188R71E103KA01D; Package: CAPC0603X85N; EDM-PN: *; Text2: *; SAAB PN: *; DCE Part No: *
footprint CAPC0603X85N (Chip Capacitor, 0603, 2-Leads, Body 1.6x0.8mm, IPC Medium Density)
pins: 1, 2

## 10nF_0603N_50V_5%_C0G/NP0
designator C?, comment value 10nF  Voltage: 50V  Text1: 0603  (hidden comment: 10nF_C0603_50V_5%_C0G/NP0)
Cap Ceramic C0G/NP0; Manufacturer: Various; Part Number: 10nF 0603 50V 5% C0G/NP0; Tol: 5%; Package: CAPC0603X85N; EDM-PN: *; Text2: *; SAAB PN: *; DCE Part No: *
footprint CAPC0603X85N (Chip Capacitor, 0603, 2-Leads, Body 1.6x0.8mm, IPC Medium Density)
pins: 1, 2

## 10nF_0603N_50V_10%_X7R
designator C?, comment value 10nF  Voltage: 50V  Text1: 0603  (hidden comment: 10nF_C0603_50V_10%_X7R)
Cap Ceramic X7R; Manufacturer: Various; Part Number: 10nF 0603 50V 10% X7R; EDM-PN: CAP361; Tol: 10%; Reutech PN: 5910-CA-0402; Package: CAPC0603X85N; Text2: *; SAAB PN: *; DCE Part No: *
footprint CAPC0603X85N (Chip Capacitor, 0603, 2-Leads, Body 1.6x0.8mm, IPC Medium Density)
pins: 1, 2

## 10nF_0603N_50V_10%_X7R-CC0603KRX7R9BB103
designator C?, comment value 10nF  Voltage: 50V  Text1: 0603  (hidden comment: 10nF_C0603_50V_10%_X7R)
Cap Ceramic X7R; Manufacturer: Yageo; Part Number: CC0603KRX7R9BB103; Tol: 10%; Package: CAPC0603X85N; EDM-PN: *; Text2: *; SAAB PN: *; DCE Part No: *
footprint CAPC0603X85N (Chip Capacitor, 0603, 2-Leads, Body 1.6x0.8mm, IPC Medium Density)
pins: 1, 2

## 10nF_0603N_50V_10%_X7R-CL10B
designator C?, comment value 10nF  Voltage: 50V  Text1: 0603  (hidden comment: CL10B103KB8NNNC)
Cap Ceramic X7R; Manufacturer: Samsung; EDM-PN: CAP1278; Tol: 10%; Part Number: CL10B103KB8NNNC; Package: CAPC0603X85N; Text2: *; Reutech PN: *; SAAB PN: *; DCE Part No: *
footprint CAPC0603X85N (Chip Capacitor, 0603, 2-Leads, Body 1.6x0.8mm, IPC Medium Density)
pins: 1, 2

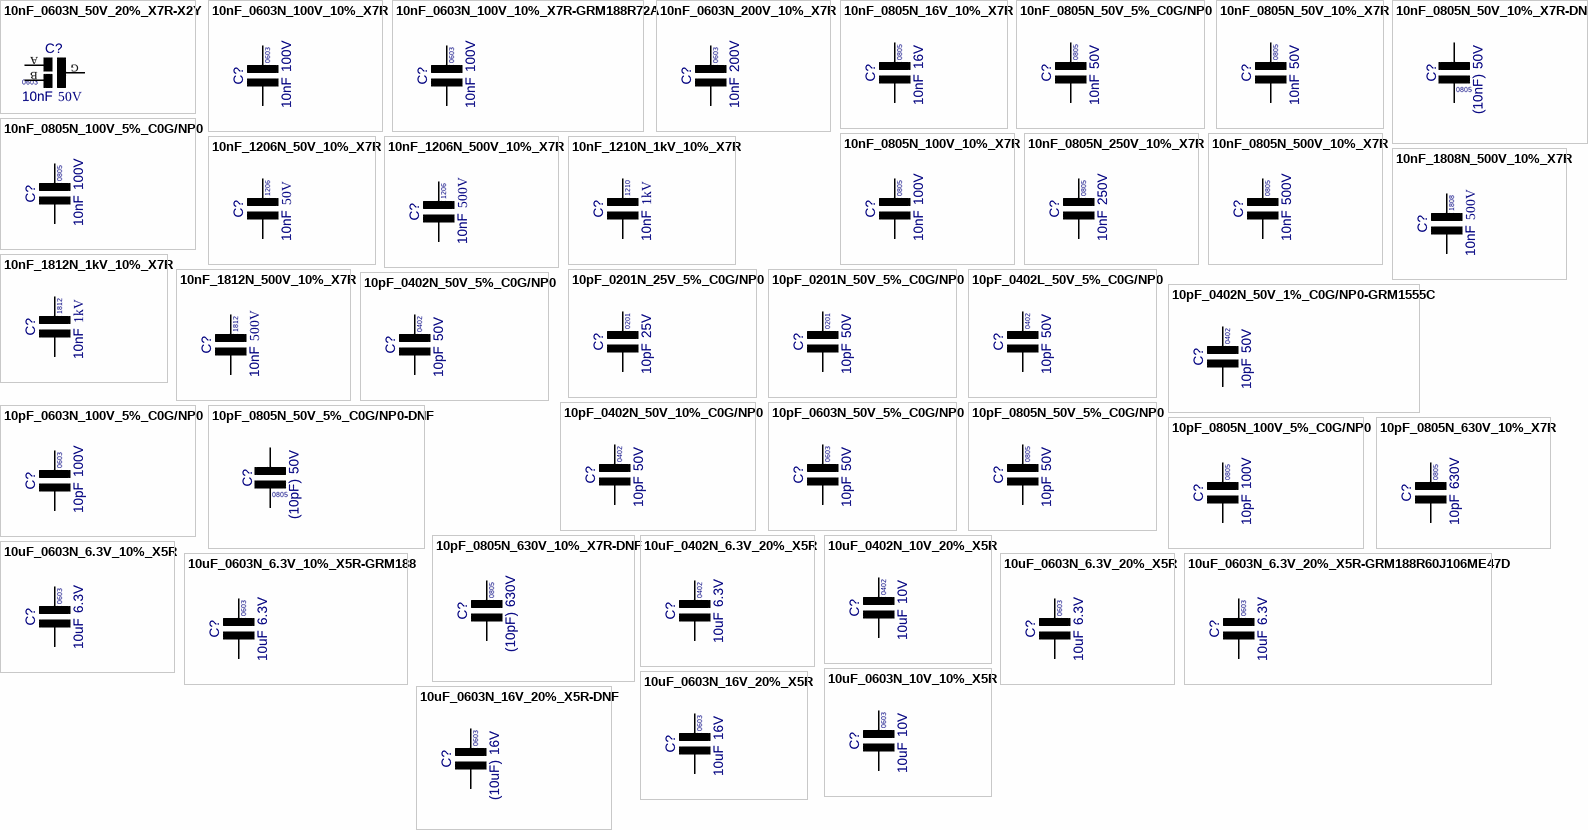
[diagram p9: symbols 10nF_0603N_50V_20%_X7R-X2Y to 10uF_0603N_16V_20%_X5R-DNF]

## 10nF_0603N_50V_20%_X7R-X2Y
designator C?, comment value 10nF  Voltage: 50V  Text1: 0603  (hidden comment: X2Y-10nF_C0603_50V_20%_X7R)
Cap Ceramic X2Y; Manufacturer: Johanson; Part Number: 500X14W103MV4T; Tol: 20%; Package: CAPC0603-X2Y; EDM-PN: *; Text2: *; SAAB PN: *; DCE Part No: *
footprint CAPC0603-X2Y (Cap 0603 X2Y 1.6x0.89mm)
pins: A, B, G

## 10nF_0603N_100V_10%_X7R
designator C?, comment value 10nF  Voltage: 100V  Text1: 0603  (hidden comment: 10nF_C0603_100V_10%_X7R)
Cap Ceramic X7R; Manufacturer: Various; Part Number: 10nF 0603 100V 10% X7R; Tol: 10%; Reutech PN: 5910-CA-0567; Package: CAPC0603X85N; EDM-PN: *; Text2: *; SAAB PN: *; DCE Part No: *
footprint CAPC0603X85N (Chip Capacitor, 0603, 2-Leads, Body 1.6x0.8mm, IPC Medium Density)
pins: 1, 2

## 10nF_0603N_100V_10%_X7R-GRM188R72A
designator C?, comment value 10nF  Voltage: 100V  Text1: 0603  (hidden comment: 10nF_C0603_100V_10%_X7R)
Cap Ceramic X7R; Manufacturer: Murata; Part Number: GRM188R72A103KA01D; Tol: 10%; Package: CAPC0603X85N; EDM-PN: *; Text2: *; SAAB PN: *; DCE Part No: *
footprint CAPC0603X85N (Chip Capacitor, 0603, 2-Leads, Body 1.6x0.8mm, IPC Medium Density)
pins: 1, 2

## 10nF_0603N_200V_10%_X7R
designator C?, comment value 10nF  Voltage: 200V  Text1: 0603  (hidden comment: 10nF_C0603_200V_10%_X7R)
Cap Ceramic X7R; Manufacturer: Various; Part Number: 10nF 0603 200V 10% X7R; Tol: 10%; Package: CAPC0603X85N; EDM-PN: *; Text2: *; SAAB PN: *; DCE Part No: *
footprint CAPC0603X85N (Chip Capacitor, 0603, 2-Leads, Body 1.6x0.8mm, IPC Medium Density)
pins: 1, 2

## 10nF_0805N_16V_10%_X7R
designator C?, comment value 10nF  Voltage: 16V  Text1: 0805  (hidden comment: 10nF_C0805_16V_10%_X7R)
Cap Ceramic X7R; Manufacturer: Various; Part Number: 10nF 0805 16V 10% X7R; Tol: 10%; Package: CAPC0805X110N; EDM-PN: *; Text2: *; SAAB PN: *; DCE Part No: *
footprint CAPC0805X110N (Chip Capacitor, 0805, 2-Leads, Body 2.0x1.3mm, IPC Medium Density)
pins: 1, 2
